# Altium schematic symbol library IC_Maxim.SchLib: 843 symbols (part 20 of 20) (continued)
## MAXQ7670AATL/V+ (continued)

## MAXQ7670ATL+
designator U?
Microcontroller with 12-Bit ADC, PGA, 64 KB Flash, and CAN Interface, -40 to 125 degC, 40-Pin QFN (T4055+1), Pb-Free; Generic Part Number: MAXQ7670A; PartNumber: MAXQ7670ATL+; Calibration Method: Integrated microcontroller with FLASH memory; Interface: CAN, SPI; Microcontroller/CPU: Microcontroller (16-bit, 16 MHz); Output Type: Digital; DatasheetVersion: Rev. 0; PackageVersion: Rev. Q, 09/2011; PackageReference: T4055+1; PackageDescription: 40-Pin Thin Quad Flatpack, No Leads, Body 5 x 5 mm, Pitch 0.4 mm; Supplier Part Number 1: MAXQ7670ATL+-ND; Supplier Part Number 2: 700-MAXQ7670ATL; DACs/ADCs: 12-bit ADC; Features: FLL, Internal Voltage Regulator ,Multiple External Interrupts ,Programmable-Gain Amplifier; Mounting Technology: Surface Mount; ComponentLink1Description: Manufacturer URL; ComponentLink1URL: http://www.maximintegrated.com/; ComponentLink2Description: Datasheet; ComponentLink2URL: http://datasheets.maximintegrated.com/en/ds/MAXQ7670A.pdf; ComponentLink3Description: Package Specification; ComponentLink3URL: http://pdfserv.maximintegrated.com/package_dwgs/21-0140.PDF
footprint QFN40_0.4-PAD(5X5) (Footprint not found)
pins: 1 AIN7 (in) "Analog Input Channel 7. AIN7 is multiplexed to the PGA or ADC as single-ended analog input 7 or as a differential input with AIN6. As a differential input, the polarity of AIN7 is negative.", 2 AIN6 (in) "Analog Input Channel 6. AIN6 is multiplexed to the PGA or ADC as a single-ended analog input 6 or as a differential input with AIN7. As a differential input, the polarity of AIN6 is positive.", 3 AIN5 (in) "Analog Input Channel 5. AIN5 is multiplexed to the PGA or ADC as single-ended analog input 5 or as a differential input with AIN4. As a differential input, the polarity of AIN5 is negative.", 4 AIN4 (in) "Analog Input Channel 4. AIN4 is multiplexed to the PGA or ADC as single-ended analog input 4 or as a differential input with AIN5. As a differential input, the polarity of AIN4 is positive.", 5 REFADC (in) "ADC External Reference Input. Connect an external reference between 1V and VAVDD.", 6 AGND (power) "Analog Ground", 7 AIN3 (in) "Analog Input Channel 3. AIN3 is multiplexed to the PGA or ADC as single-ended analog input 3 or as a differential input with AIN2. As a differential input, the polarity of AIN3 is negative.", 8 AIN2 (in) "Analog Input Channel 2. AIN2 is multiplexed to the PGA or ADC as single-ended analog input 2 or as a differential input with AIN3. As a differential input, the polarity of AIN2 is positive.", 9 AIN1 (in) "Analog Input Channel 1. AIN1 is multiplexed to the PGA or ADC as single-ended analog input 1 or as a differential input with AIN0. As a differential input, the polarity of AIN1 is negative.", 10 AIN0 (in) "Analog Input Channel 0. AIN0 is multiplexed to the PGA or ADC as single-ended analog input 0 or as a differential input with AIN1. As a differential input, the polarity of AIN0 is positive.", 11 IC "Internally Connected. Connect to GNDIO for proper operation.", 12 P0.0 (io) "Port 0 Bit 0. P0.0 is a general-purpose digital I/O with interrupt/wake-up capability.", 13 P0.1 (io) "Port 0 Bit 1. P0.1 is a general-purpose digital I/O with interrupt/wake-up capability.", 14 P0.2 (io) "Port 0 Bit 2. P0.2 is a general-purpose digital I/O with interrupt/wake-up capability.", 15 GNDIO (power) "Digital I/O Ground and Regulator Ground", 16 CANRXD (in) "CAN Bus Receiver Input. CAN receiver input.", 17 CANTXD (out) "CAN Bus Transmitter Output. CAN transmitter output.", 18 ~{SS} (in) "Active-Low, SPI Port Slave Select Input. In SPI slave mode, this is the slave select input. In SPI master mode, this is an input and connection is optional (connect if mode fault enable is required, refer to the MAXQ7670 (See Datasheet)", 19 P0.6/T0 (io), 20 P0.7/T0B (io), 21 DVDDIO (power) "Digital I/O Supply Voltage and Regulator Supply Input. DVDDIO supplies all digital I/O except for XIN and XOUT, and supplies power to the two internal linear regulators, AVDD and DVDD. Bypass DVDDIO to GNDIO with a 0.1uF (See Datasheet)", 22 GNDIO (power) "Digital I/O Ground and Regulator Ground", 23 SCLK (io) "SPI Serial Clock. SCLK is the SPI interface serial clock I/O. In SPI master mode, SCLK is an output. While in SPI slave mode, SCLK is an input.", 24 MOSI (io) "SPI Serial Data I/O. MOSI is the SPI interface serial data output in master mode or serial data input in slave mode.", 25 MISO (io) "SPI Serial Data I/O. MISO is the SPI interface serial data input in master mode or serial data output in slave mode.", 26 ~{REGEN2} (in) "Active-Low +2.5V Linear Regulator Enable Input. Connect R\E\G\E\N\2\ to GNDIO to enable the +2.5V linear regulator. Connect to DVDDIO to disable the +2.5V linear regulator.", 27 TDO (out) "JTAG Serial Test Data Output. TDO is the JTAG serial test, data output.", 28 TMS (in) "JTAG Test Mode Select. TMS is the JTAG test mode, select input.", 29 TDI (in) "JTAG Serial Test Data Input. TDI is the JTAG serial test, data input.", 30 TCK (in) "JTAG Serial Test Clock Input. TCK is the JTAG serial test, clock input.", 31 P0.4/ADCCNV (io), 32 P0.5 (io) "Port 0 Bit 5. P0.5 is a general-purpose digital I/O with interrupt/wake-up capability.", 33 ~{RESET} (io) "Reset Input/Output. Active-low input/output with internal 55k ohm pullup to DVDDIO. Drive low to reset the MAXQ7670A. The MAXQ20 uC core holds R\E\S\E\T\ low during POR and during DVDD brownout conditions.", 34 DGND (power) "Digital Ground", 35 XOUT "High-Frequency Crystal Output. Connect an external crystal to XIN and XOUT for normal operation, or leave unconnected if XIN is driven with an external clock source. Leave unconnected if an external clock source is not used.", 36 XIN "High-Frequency Crystal Input. Connect an external crystal or resonator to XIN and XOUT for normal operation, or drive XIN with an external clock source. Leave unconnected if an external clock source is not used .", 37 DVDD (power) "Digital Supply Voltage. DVDD supplies internal digital core and flash memory. DVDD is directly connected to the output of the internal + 2.5V linear regulator . Disable the internal regulator (through R\E\G\E\N\2\) to (See Datasheet)", 38 GNDIO (power) "Digital I/O Ground and Regulator Ground", 39 DVDDIO (power) "Digital I/O Supply Voltage and Regulator Supply Input. DVDDIO supplies all digital I/O except for XIN and XOUT, and supplies power to the two internal linear regulators, AVDD and DVDD. Bypass DVDDIO to GNDIO with a 0.1uF (See Datasheet)", 40 AVDD (power) "Analog Supply Voltage. AVDD supplies PGA and ADC. AVDD is directly connected to the output of the internal +3.3V linear regulator. Disable the internal regulator (via software) to connect an external supply.Bypass AVDD to (See Datasheet)", 41 EP (power) "Exposed Pad. Connect EP to the ground plane."

## MAXQ7670ATL/V+
designator U?
Microcontroller with 12-Bit ADC, PGA, 64 KB Flash, and CAN Interface, -40 to 125 degC, 40-Pin QFN (T4055+1), Pb-Free; Generic Part Number: MAXQ7670A; PartNumber: MAXQ7670ATL/V+; Calibration Method: Integrated microcontroller with FLASH memory; Interface: CAN, SPI; Microcontroller/CPU: Microcontroller (16-bit, 16 MHz); Output Type: Digital; DatasheetVersion: Rev. 0; PackageVersion: Rev. Q, 09/2011; PackageReference: T4055+1; PackageDescription: 40-Pin Thin Quad Flatpack, No Leads, Body 5 x 5 mm, Pitch 0.4 mm; Supplier Part Number 1: MAXQ7670ATL/V+-ND; Supplier Part Number 2: 700-MAXQ7670ATL/V; DACs/ADCs: 12-bit ADC; Features: FLL, Internal Voltage Regulator ,Multiple External Interrupts ,Programmable-Gain Amplifier; Mounting Technology: Surface Mount; ComponentLink1Description: Manufacturer URL; ComponentLink1URL: http://www.maximintegrated.com/; ComponentLink2Description: Datasheet; ComponentLink2URL: http://datasheets.maximintegrated.com/en/ds/MAXQ7670A.pdf; ComponentLink3Description: Package Specification; ComponentLink3URL: http://pdfserv.maximintegrated.com/package_dwgs/21-0140.PDF
footprint QFN40_0.4-PAD(5X5) (Footprint not found)
pins: 1 AIN7 (in) "Analog Input Channel 7. AIN7 is multiplexed to the PGA or ADC as single-ended analog input 7 or as a differential input with AIN6. As a differential input, the polarity of AIN7 is negative.", 2 AIN6 (in) "Analog Input Channel 6. AIN6 is multiplexed to the PGA or ADC as a single-ended analog input 6 or as a differential input with AIN7. As a differential input, the polarity of AIN6 is positive.", 3 AIN5 (in) "Analog Input Channel 5. AIN5 is multiplexed to the PGA or ADC as single-ended analog input 5 or as a differential input with AIN4. As a differential input, the polarity of AIN5 is negative.", 4 AIN4 (in) "Analog Input Channel 4. AIN4 is multiplexed to the PGA or ADC as single-ended analog input 4 or as a differential input with AIN5. As a differential input, the polarity of AIN4 is positive.", 5 REFADC (in) "ADC External Reference Input. Connect an external reference between 1V and VAVDD.", 6 AGND (power) "Analog Ground", 7 AIN3 (in) "Analog Input Channel 3. AIN3 is multiplexed to the PGA or ADC as single-ended analog input 3 or as a differential input with AIN2. As a differential input, the polarity of AIN3 is negative.", 8 AIN2 (in) "Analog Input Channel 2. AIN2 is multiplexed to the PGA or ADC as single-ended analog input 2 or as a differential input with AIN3. As a differential input, the polarity of AIN2 is positive.", 9 AIN1 (in) "Analog Input Channel 1. AIN1 is multiplexed to the PGA or ADC as single-ended analog input 1 or as a differential input with AIN0. As a differential input, the polarity of AIN1 is negative.", 10 AIN0 (in) "Analog Input Channel 0. AIN0 is multiplexed to the PGA or ADC as single-ended analog input 0 or as a differential input with AIN1. As a differential input, the polarity of AIN0 is positive.", 11 IC "Internally Connected. Connect to GNDIO for proper operation.", 12 P0.0 (io) "Port 0 Bit 0. P0.0 is a general-purpose digital I/O with interrupt/wake-up capability.", 13 P0.1 (io) "Port 0 Bit 1. P0.1 is a general-purpose digital I/O with interrupt/wake-up capability.", 14 P0.2 (io) "Port 0 Bit 2. P0.2 is a general-purpose digital I/O with interrupt/wake-up capability.", 15 GNDIO (power) "Digital I/O Ground and Regulator Ground", 16 CANRXD (in) "CAN Bus Receiver Input. CAN receiver input.", 17 CANTXD (out) "CAN Bus Transmitter Output. CAN transmitter output.", 18 ~{SS} (in) "Active-Low, SPI Port Slave Select Input. In SPI slave mode, this is the slave select input. In SPI master mode, this is an input and connection is optional (connect if mode fault enable is required, refer to the MAXQ7670 (See Datasheet)", 19 P0.6/T0 (io), 20 P0.7/T0B (io), 21 DVDDIO (power) "Digital I/O Supply Voltage and Regulator Supply Input. DVDDIO supplies all digital I/O except for XIN and XOUT, and supplies power to the two internal linear regulators, AVDD and DVDD. Bypass DVDDIO to GNDIO with a 0.1uF (See Datasheet)", 22 GNDIO (power) "Digital I/O Ground and Regulator Ground", 23 SCLK (io) "SPI Serial Clock. SCLK is the SPI interface serial clock I/O. In SPI master mode, SCLK is an output. While in SPI slave mode, SCLK is an input.", 24 MOSI (io) "SPI Serial Data I/O. MOSI is the SPI interface serial data output in master mode or serial data input in slave mode.", 25 MISO (io) "SPI Serial Data I/O. MISO is the SPI interface serial data input in master mode or serial data output in slave mode.", 26 ~{REGEN2} (in) "Active-Low +2.5V Linear Regulator Enable Input. Connect R\E\G\E\N\2\ to GNDIO to enable the +2.5V linear regulator. Connect to DVDDIO to disable the +2.5V linear regulator.", 27 TDO (out) "JTAG Serial Test Data Output. TDO is the JTAG serial test, data output.", 28 TMS (in) "JTAG Test Mode Select. TMS is the JTAG test mode, select input.", 29 TDI (in) "JTAG Serial Test Data Input. TDI is the JTAG serial test, data input.", 30 TCK (in) "JTAG Serial Test Clock Input. TCK is the JTAG serial test, clock input.", 31 P0.4/ADCCNV (io), 32 P0.5 (io) "Port 0 Bit 5. P0.5 is a general-purpose digital I/O with interrupt/wake-up capability.", 33 ~{RESET} (io) "Reset Input/Output. Active-low input/output with internal 55k ohm pullup to DVDDIO. Drive low to reset the MAXQ7670A. The MAXQ20 uC core holds R\E\S\E\T\ low during POR and during DVDD brownout conditions.", 34 DGND (power) "Digital Ground", 35 XOUT "High-Frequency Crystal Output. Connect an external crystal to XIN and XOUT for normal operation, or leave unconnected if XIN is driven with an external clock source. Leave unconnected if an external clock source is not used.", 36 XIN "High-Frequency Crystal Input. Connect an external crystal or resonator to XIN and XOUT for normal operation, or drive XIN with an external clock source. Leave unconnected if an external clock source is not used .", 37 DVDD (power) "Digital Supply Voltage. DVDD supplies internal digital core and flash memory. DVDD is directly connected to the output of the internal + 2.5V linear regulator . Disable the internal regulator (through R\E\G\E\N\2\) to (See Datasheet)", 38 GNDIO (power) "Digital I/O Ground and Regulator Ground", 39 DVDDIO (power) "Digital I/O Supply Voltage and Regulator Supply Input. DVDDIO supplies all digital I/O except for XIN and XOUT, and supplies power to the two internal linear regulators, AVDD and DVDD. Bypass DVDDIO to GNDIO with a 0.1uF (See Datasheet)", 40 AVDD (power) "Analog Supply Voltage. AVDD supplies PGA and ADC. AVDD is directly connected to the output of the internal +3.3V linear regulator. Disable the internal regulator (via software) to connect an external supply.Bypass AVDD to (See Datasheet)", 41 EP (power) "Exposed Pad. Connect EP to the ground plane."

## MXB7843EEE
designator U?
4 Channels, 2.375 to 5.25 V, 4-Wire Touch-Screen Controller, -40 to 85 degC, 16-Pin SOP (E16-5); Generic Part Number: MXB7843; PartNumber: MXB7843EEE; Channels: 4; Controller Type: Resistive; EV Kit: Yes; Interface: QSPI, SPI; DatasheetVersion: Rev. 1; PackageVersion: Rev. K, 04/2012; PackageReference: E16-5; PackageDescription: 16-Pin Quarter Small-Outline Package, Body 3.9 x 4.89 mm, Pitch 0.635 mm; Supplier Part Number 1: N/A; Mounting Technology: Surface Mount; Code_JEDEC: MO-137; ComponentLink1Description: Manufacturer URL; ComponentLink1URL: http://www.maximintegrated.com/; ComponentLink2Description: Datasheet; ComponentLink2URL: http://datasheets.maximintegrated.com/en/ds/MXB7843.pdf; ComponentLink3Description: Package Specification; ComponentLink3URL: http://pdfserv.maximintegrated.com/package_dwgs/21-0055.PDF
footprint SSOP16_0.635 (Footprint not found)
pins: 1 VDD (power) "Positive Supply Voltage. Connect to pin 10.", 2 X+ (in) "X+ Position Input, ADC Input Channel 1", 3 Y+ (in) "Y+ Position Input, ADC Input Channel 2", 4 X- (in) "X- Position Input", 5 Y- (in) "Y- Position Input", 6 GND (power) "Ground", 7 IN3 (in) "Auxiliary Input to ADC; ADC Input Channel 3", 8 IN4 (in) "Auxiliary Input to ADC; ADC Input Channel 4", 9 REF (in) "Voltage Reference Input. Reference voltage for analog-to-digital conversion. Apply a reference voltage between 1V and VDD. Bypass REF to GND with a 0.1uF capacitor.", 10 VDD (power) "Positive Supply Voltage, +2.375V to +5.25V. Bypass with a 1uF capacitor. Connect to pin 1.", 11 ~{PENIRQ} (out) "Pen Interrupt Output. Open anode output. 10k ohm to 100k ohm pullup resistor required to VDD.", 12 DOUT (hiz) "Serial Data Output. Data changes state on the falling edge of DCLK. High impedance when C\S\ is HIGH.", 13 BUSY (hiz) "Busy Output. BUSY pulses high for one clock period before the MSB decision. High impedance when C\S\ is HIGH.", 14 DIN (in) "Serial Data Input. Data clocked in on the rising edge of DCLK.", 15 ~{CS} (in) "Active-Low Chip Select. Data is only clocked into DIN when C\S\ is low. When C\S\ is high, DOUT and BUSY are high impedance", 16 DCLK (in) "Serial Clock Input. Clocks data in and out of the serial interface and sets the conversion speed (duty cycle must be 40% to 60%)."

## MXB7843EEE+
designator U?
4 Channels, 2.375 to 5.25 V, 4-Wire Touch-Screen Controller, -40 to 85 degC, 16-Pin SOP (E16+5), Pb-Free; Generic Part Number: MXB7843; PartNumber: MXB7843EEE+; Channels: 4; Controller Type: Resistive; EV Kit: Yes; Interface: QSPI, SPI; DatasheetVersion: Rev. 1; PackageVersion: Rev. K, 04/2012; PackageReference: E16+5; PackageDescription: 16-Pin Quarter Small-Outline Package, Body 3.9 x 4.89 mm, Pitch 0.635 mm; Supplier Part Number 1: MXB7843EEE+-ND; Supplier Part Number 2: 23K7085; Supplier Part Number 3: 700-MXB7843EEE; Mounting Technology: Surface Mount; Code_JEDEC: MO-137; ComponentLink1Description: Manufacturer URL; ComponentLink1URL: http://www.maximintegrated.com/; ComponentLink2Description: Datasheet; ComponentLink2URL: http://datasheets.maximintegrated.com/en/ds/MXB7843.pdf; ComponentLink3Description: Package Specification; ComponentLink3URL: http://pdfserv.maximintegrated.com/package_dwgs/21-0055.PDF
footprint SSOP16_0.635 (Footprint not found)
pins: 1 VDD (power) "Positive Supply Voltage. Connect to pin 10.", 2 X+ (in) "X+ Position Input, ADC Input Channel 1", 3 Y+ (in) "Y+ Position Input, ADC Input Channel 2", 4 X- (in) "X- Position Input", 5 Y- (in) "Y- Position Input", 6 GND (power) "Ground", 7 IN3 (in) "Auxiliary Input to ADC; ADC Input Channel 3", 8 IN4 (in) "Auxiliary Input to ADC; ADC Input Channel 4", 9 REF (in) "Voltage Reference Input. Reference voltage for analog-to-digital conversion. Apply a reference voltage between 1V and VDD. Bypass REF to GND with a 0.1uF capacitor.", 10 VDD (power) "Positive Supply Voltage, +2.375V to +5.25V. Bypass with a 1uF capacitor. Connect to pin 1.", 11 ~{PENIRQ} (out) "Pen Interrupt Output. Open anode output. 10k ohm to 100k ohm pullup resistor required to VDD.", 12 DOUT (hiz) "Serial Data Output. Data changes state on the falling edge of DCLK. High impedance when C\S\ is HIGH.", 13 BUSY (hiz) "Busy Output. BUSY pulses high for one clock period before the MSB decision. High impedance when C\S\ is HIGH.", 14 DIN (in) "Serial Data Input. Data clocked in on the rising edge of DCLK.", 15 ~{CS} (in) "Active-Low Chip Select. Data is only clocked into DIN when C\S\ is low. When C\S\ is high, DOUT and BUSY are high impedance", 16 DCLK (in) "Serial Clock Input. Clocks data in and out of the serial interface and sets the conversion speed (duty cycle must be 40% to 60%)."

## MXB7843EUE
designator U?
4 Channels, 2.375 to 5.25 V, 4-Wire Touch-Screen Controller, -40 to 85 degC, 16-Pin SOP (U16-1); Generic Part Number: MXB7843; PartNumber: MXB7843EUE; Channels: 4; Controller Type: Resistive; EV Kit: Yes; Interface: QSPI, SPI; DatasheetVersion: Rev. 1; PackageVersion: Rev. L, 07/2010; PackageReference: U16-1; PackageDescription: 16-Pin Thin Shrink Small-Outline Package (U16-1), Body 5 x 4.4 mm, Pitch 0.65 mm; Supplier Part Number 1: N/A; Mounting Technology: Surface Mount; Code_JEDEC: MO-153; ComponentLink1Description: Manufacturer URL; ComponentLink1URL: http://www.maximintegrated.com/; ComponentLink2Description: Datasheet; ComponentLink2URL: http://datasheets.maximintegrated.com/en/ds/MXB7843.pdf; ComponentLink3Description: Package Specification; ComponentLink3URL: http://pdfserv.maximintegrated.com/package_dwgs/21-0066.PDF
footprint TSSOP16_0.65 (Footprint not found)
pins: 1 VDD (power) "Positive Supply Voltage. Connect to pin 10.", 2 X+ (in) "X+ Position Input, ADC Input Channel 1", 3 Y+ (in) "Y+ Position Input, ADC Input Channel 2", 4 X- (in) "X- Position Input", 5 Y- (in) "Y- Position Input", 6 GND (power) "Ground", 7 IN3 (in) "Auxiliary Input to ADC; ADC Input Channel 3", 8 IN4 (in) "Auxiliary Input to ADC; ADC Input Channel 4", 9 REF (in) "Voltage Reference Input. Reference voltage for analog-to-digital conversion. Apply a reference voltage between 1V and VDD. Bypass REF to GND with a 0.1uF capacitor.", 10 VDD (power) "Positive Supply Voltage, +2.375V to +5.25V. Bypass with a 1uF capacitor. Connect to pin 1.", 11 ~{PENIRQ} (out) "Pen Interrupt Output. Open anode output. 10k ohm to 100k ohm pullup resistor required to VDD.", 12 DOUT (hiz) "Serial Data Output. Data changes state on the falling edge of DCLK. High impedance when C\S\ is HIGH.", 13 BUSY (hiz) "Busy Output. BUSY pulses high for one clock period before the MSB decision. High impedance when C\S\ is HIGH.", 14 DIN (in) "Serial Data Input. Data clocked in on the rising edge of DCLK.", 15 ~{CS} (in) "Active-Low Chip Select. Data is only clocked into DIN when C\S\ is low. When C\S\ is high, DOUT and BUSY are high impedance", 16 DCLK (in) "Serial Clock Input. Clocks data in and out of the serial interface and sets the conversion speed (duty cycle must be 40% to 60%)."

## MXB7843EUE+
designator U?
4 Channels, 2.375 to 5.25 V, 4-Wire Touch-Screen Controller, -40 to 85 degC, 16-Pin SOP (U16+1), Pb-Free; Generic Part Number: MXB7843; PartNumber: MXB7843EUE+; Channels: 4; Controller Type: Resistive; EV Kit: Yes; Interface: QSPI, SPI; DatasheetVersion: Rev. 1; PackageVersion: Rev. L, 07/2010; PackageReference: U16+1; PackageDescription: 16-Pin Thin Shrink Small-Outline Package (U16+1), Body 5 x 4.4 mm, Pitch 0.65 mm; Supplier Part Number 1: MXB7843EUE+-ND; Supplier Part Number 2: 700-MXB7843EUE; Mounting Technology: Surface Mount; Code_JEDEC: MO-153; ComponentLink1Description: Manufacturer URL; ComponentLink1URL: http://www.maximintegrated.com/; ComponentLink2Description: Datasheet; ComponentLink2URL: http://datasheets.maximintegrated.com/en/ds/MXB7843.pdf; ComponentLink3Description: Package Specification; ComponentLink3URL: http://pdfserv.maximintegrated.com/package_dwgs/21-0066.PDF
footprint TSSOP16_0.65 (Footprint not found)
pins: 1 VDD (power) "Positive Supply Voltage. Connect to pin 10.", 2 X+ (in) "X+ Position Input, ADC Input Channel 1", 3 Y+ (in) "Y+ Position Input, ADC Input Channel 2", 4 X- (in) "X- Position Input", 5 Y- (in) "Y- Position Input", 6 GND (power) "Ground", 7 IN3 (in) "Auxiliary Input to ADC; ADC Input Channel 3", 8 IN4 (in) "Auxiliary Input to ADC; ADC Input Channel 4", 9 REF (in) "Voltage Reference Input. Reference voltage for analog-to-digital conversion. Apply a reference voltage between 1V and VDD. Bypass REF to GND with a 0.1uF capacitor.", 10 VDD (power) "Positive Supply Voltage, +2.375V to +5.25V. Bypass with a 1uF capacitor. Connect to pin 1.", 11 ~{PENIRQ} (out) "Pen Interrupt Output. Open anode output. 10k ohm to 100k ohm pullup resistor required to VDD.", 12 DOUT (hiz) "Serial Data Output. Data changes state on the falling edge of DCLK. High impedance when C\S\ is HIGH.", 13 BUSY (hiz) "Busy Output. BUSY pulses high for one clock period before the MSB decision. High impedance when C\S\ is HIGH.", 14 DIN (in) "Serial Data Input. Data clocked in on the rising edge of DCLK.", 15 ~{CS} (in) "Active-Low Chip Select. Data is only clocked into DIN when C\S\ is low. When C\S\ is high, DOUT and BUSY are high impedance", 16 DCLK (in) "Serial Clock Input. Clocks data in and out of the serial interface and sets the conversion speed (duty cycle must be 40% to 60%)."

## MXB7846EEE
designator U?
4 Channels, 2.375 to 5.25 V, 4-Wire Touch-Screen Controller with Internal Reference and Temperature Sensor, -40 to 85 degC, 16-Pin SOP (E16-5); Generic Part Number: MXB7846; PartNumber: MXB7846EEE; Channels: 4; Controller Type: Resistive; EV Kit: Yes; Interface: QSPI, SPI; DatasheetVersion: Rev. 2; PackageVersion: Rev. K, 04/2012; PackageReference: E16-5; PackageDescription: 16-Pin Quarter Small-Outline Package, Body 3.9 x 4.89 mm, Pitch 0.635 mm; Supplier Part Number 1: N/A; Mounting Technology: Surface Mount; Code_JEDEC: MO-137; ComponentLink1Description: Manufacturer URL; ComponentLink1URL: http://www.maximintegrated.com/; ComponentLink2Description: Datasheet; ComponentLink2URL: http://datasheets.maximintegrated.com/en/ds/MXB7846.pdf; ComponentLink3Description: Package Specification; ComponentLink3URL: http://pdfserv.maximintegrated.com/package_dwgs/21-0055.PDF
footprint SSOP16_0.635 (Footprint not found)
pins: 1 VDD (power) "Positive Supply Voltage. Connect to pin 10.", 2 X+ (in) "X+ Position Input, ADC Input Channel 1", 3 Y+ (in) "Y+ Position Input, ADC Input Channel 2", 4 X- (in) "X- Position Input", 5 Y- (in) "Y- Position Input", 6 GND (power) "Ground", 7 BAT (in) "Battery Monitoring Inputs; ADC Input Channel 3", 8 AUX (in) "Auxiliary Input to ADC; ADC Input Channel 4", 9 REF (io) "Voltage Reference Output/Input. Reference voltage for analog-to-digital conversion. In internal reference mode, the reference buffer provides a 2.50V nominal output. In external reference mode, apply a reference voltage (See Datasheet)", 10 VDD (power) "Positive Supply Voltage, +2.375V (2.70V) to +5.25V. External (internal) reference. Bypass with a 1uF capacitor. Connect to pin 1.", 11 ~{PENIRQ} (oc) "Pen Interrupt Output. Open anode output. 10k ohm to 100k ohm pullup resistor required to VDD.", 12 DOUT (hiz) "Serial Data Output. Data changes state on the falling edge of DCLK. High impedance when C\S\ is HIGH.", 13 BUSY (hiz) "Busy Output. BUSY pulses high for one clock period before the MSB decision. High impedance when C\S\ is HIGH.", 14 DIN (in) "Serial Data Input. Data clocked in on the rising edge of DCLK.", 15 ~{CS} (in) "Active-Low Chip Select. Data is only clocked into DIN when C\S\ is low. When C\S\ is HIGH, DOUT and BUSY are high impedance", 16 DCLK (in) "Serial Clock Input. Clocks data in and out of the serial interface and sets the conversion speed (duty cycle must be 40% to 60%)."

## MXB7846EEE+
designator U?
4 Channels, 2.375 to 5.25 V, 4-Wire Touch-Screen Controller with Internal Reference and Temperature Sensor, -40 to 85 degC, 16-Pin SOP (E16+5), Pb-Free; Generic Part Number: MXB7846; PartNumber: MXB7846EEE+; Channels: 4; Controller Type: Resistive; EV Kit: Yes; Interface: QSPI, SPI; DatasheetVersion: Rev. 2; PackageVersion: Rev. K, 04/2012; PackageReference: E16+5; PackageDescription: 16-Pin Quarter Small-Outline Package, Body 3.9 x 4.89 mm, Pitch 0.635 mm; Supplier Part Number 1: MXB7846EEE+-ND; Supplier Part Number 2: 700-MXB7846EEE; Mounting Technology: Surface Mount; Code_JEDEC: MO-137; ComponentLink1Description: Manufacturer URL; ComponentLink1URL: http://www.maximintegrated.com/; ComponentLink2Description: Datasheet; ComponentLink2URL: http://datasheets.maximintegrated.com/en/ds/MXB7846.pdf; ComponentLink3Description: Package Specification; ComponentLink3URL: http://pdfserv.maximintegrated.com/package_dwgs/21-0055.PDF
footprint SSOP16_0.635 (Footprint not found)
pins: 1 VDD (power) "Positive Supply Voltage. Connect to pin 10.", 2 X+ (in) "X+ Position Input, ADC Input Channel 1", 3 Y+ (in) "Y+ Position Input, ADC Input Channel 2", 4 X- (in) "X- Position Input", 5 Y- (in) "Y- Position Input", 6 GND (power) "Ground", 7 BAT (in) "Battery Monitoring Inputs; ADC Input Channel 3", 8 AUX (in) "Auxiliary Input to ADC; ADC Input Channel 4", 9 REF (io) "Voltage Reference Output/Input. Reference voltage for analog-to-digital conversion. In internal reference mode, the reference buffer provides a 2.50V nominal output. In external reference mode, apply a reference voltage (See Datasheet)", 10 VDD (power) "Positive Supply Voltage, +2.375V (2.70V) to +5.25V. External (internal) reference. Bypass with a 1uF capacitor. Connect to pin 1.", 11 ~{PENIRQ} (oc) "Pen Interrupt Output. Open anode output. 10k ohm to 100k ohm pullup resistor required to VDD.", 12 DOUT (hiz) "Serial Data Output. Data changes state on the falling edge of DCLK. High impedance when C\S\ is HIGH.", 13 BUSY (hiz) "Busy Output. BUSY pulses high for one clock period before the MSB decision. High impedance when C\S\ is HIGH.", 14 DIN (in) "Serial Data Input. Data clocked in on the rising edge of DCLK.", 15 ~{CS} (in) "Active-Low Chip Select. Data is only clocked into DIN when C\S\ is low. When C\S\ is HIGH, DOUT and BUSY are high impedance", 16 DCLK (in) "Serial Clock Input. Clocks data in and out of the serial interface and sets the conversion speed (duty cycle must be 40% to 60%)."

## MXB7846EUE
designator U?
4 Channels, 2.375 to 5.25 V, 4-Wire Touch-Screen Controller with Internal Reference and Temperature Sensor, -40 to 85 degC, 16-Pin SOP (U16-1); Generic Part Number: MXB7846; PartNumber: MXB7846EUE; Channels: 4; Controller Type: Resistive; EV Kit: Yes; Interface: QSPI, SPI; DatasheetVersion: Rev. 2; PackageVersion: Rev. L, 07/2010; PackageReference: U16-1; PackageDescription: 16-Pin Thin Shrink Small-Outline Package (U16-1), Body 5 x 4.4 mm, Pitch 0.65 mm; Supplier Part Number 1: N/A; Mounting Technology: Surface Mount; Code_JEDEC: MO-153; ComponentLink1Description: Manufacturer URL; ComponentLink1URL: http://www.maximintegrated.com/; ComponentLink2Description: Datasheet; ComponentLink2URL: http://datasheets.maximintegrated.com/en/ds/MXB7846.pdf; ComponentLink3Description: Package Specification; ComponentLink3URL: http://pdfserv.maximintegrated.com/package_dwgs/21-0066.PDF
footprint TSSOP16_0.65 (Footprint not found)
pins: 1 VDD (power) "Positive Supply Voltage. Connect to pin 10.", 2 X+ (in) "X+ Position Input, ADC Input Channel 1", 3 Y+ (in) "Y+ Position Input, ADC Input Channel 2", 4 X- (in) "X- Position Input", 5 Y- (in) "Y- Position Input", 6 GND (power) "Ground", 7 BAT (in) "Battery Monitoring Inputs; ADC Input Channel 3", 8 AUX (in) "Auxiliary Input to ADC; ADC Input Channel 4", 9 REF (io) "Voltage Reference Output/Input. Reference voltage for analog-to-digital conversion. In internal reference mode, the reference buffer provides a 2.50V nominal output. In external reference mode, apply a reference voltage (See Datasheet)", 10 VDD (power) "Positive Supply Voltage, +2.375V (2.70V) to +5.25V. External (internal) reference. Bypass with a 1uF capacitor. Connect to pin 1.", 11 ~{PENIRQ} (oc) "Pen Interrupt Output. Open anode output. 10k ohm to 100k ohm pullup resistor required to VDD.", 12 DOUT (hiz) "Serial Data Output. Data changes state on the falling edge of DCLK. High impedance when C\S\ is HIGH.", 13 BUSY (hiz) "Busy Output. BUSY pulses high for one clock period before the MSB decision. High impedance when C\S\ is HIGH.", 14 DIN (in) "Serial Data Input. Data clocked in on the rising edge of DCLK.", 15 ~{CS} (in) "Active-Low Chip Select. Data is only clocked into DIN when C\S\ is low. When C\S\ is HIGH, DOUT and BUSY are high impedance", 16 DCLK (in) "Serial Clock Input. Clocks data in and out of the serial interface and sets the conversion speed (duty cycle must be 40% to 60%)."

## MXB7846EUE+
designator U?
4 Channels, 2.375 to 5.25 V, 4-Wire Touch-Screen Controller with Internal Reference and Temperature Sensor, -40 to 85 degC, 16-Pin SOP (U16+1), Pb-Free; Generic Part Number: MXB7846; PartNumber: MXB7846EUE+; Channels: 4; Controller Type: Resistive; EV Kit: Yes; Interface: QSPI, SPI; DatasheetVersion: Rev. 2; PackageVersion: Rev. L, 07/2010; PackageReference: U16+1; PackageDescription: 16-Pin Thin Shrink Small-Outline Package (U16+1), Body 5 x 4.4 mm, Pitch 0.65 mm; Supplier Part Number 1: MXB7846EUE+-ND; Supplier Part Number 2: 700-MXB7846EUE; Mounting Technology: Surface Mount; Code_JEDEC: MO-153; ComponentLink1Description: Manufacturer URL; ComponentLink1URL: http://www.maximintegrated.com/; ComponentLink2Description: Datasheet; ComponentLink2URL: http://datasheets.maximintegrated.com/en/ds/MXB7846.pdf; ComponentLink3Description: Package Specification; ComponentLink3URL: http://pdfserv.maximintegrated.com/package_dwgs/21-0066.PDF
footprint TSSOP16_0.65 (Footprint not found)
pins: 1 VDD (power) "Positive Supply Voltage. Connect to pin 10.", 2 X+ (in) "X+ Position Input, ADC Input Channel 1", 3 Y+ (in) "Y+ Position Input, ADC Input Channel 2", 4 X- (in) "X- Position Input", 5 Y- (in) "Y- Position Input", 6 GND (power) "Ground", 7 BAT (in) "Battery Monitoring Inputs; ADC Input Channel 3", 8 AUX (in) "Auxiliary Input to ADC; ADC Input Channel 4", 9 REF (io) "Voltage Reference Output/Input. Reference voltage for analog-to-digital conversion. In internal reference mode, the reference buffer provides a 2.50V nominal output. In external reference mode, apply a reference voltage (See Datasheet)", 10 VDD (power) "Positive Supply Voltage, +2.375V (2.70V) to +5.25V. External (internal) reference. Bypass with a 1uF capacitor. Connect to pin 1.", 11 ~{PENIRQ} (oc) "Pen Interrupt Output. Open anode output. 10k ohm to 100k ohm pullup resistor required to VDD.", 12 DOUT (hiz) "Serial Data Output. Data changes state on the falling edge of DCLK. High impedance when C\S\ is HIGH.", 13 BUSY (hiz) "Busy Output. BUSY pulses high for one clock period before the MSB decision. High impedance when C\S\ is HIGH.", 14 DIN (in) "Serial Data Input. Data clocked in on the rising edge of DCLK.", 15 ~{CS} (in) "Active-Low Chip Select. Data is only clocked into DIN when C\S\ is low. When C\S\ is HIGH, DOUT and BUSY are high impedance", 16 DCLK (in) "Serial Clock Input. Clocks data in and out of the serial interface and sets the conversion speed (duty cycle must be 40% to 60%)."